# Altium schematic symbol library Analog Devices Data Converters Digital-to-Analog Converters.SchLib: 2231 symbols (part 41 of 135) (continued)
## AD5398BCPZ-REEL7
designator U?
Single 10-Bit Current Sinking Digital-to-Analog Converter with I2C Interface, 120 mA, -40 to +85 degC, CP-8-2, Pb-Free, Reel; Generic Part Number: AD5398; Manufacturer: Analog Devices; PartNumber: AD5398BCPZ-REEL7; # DAC Outputs: 1; Max V+: 5.5V; Op Pwr Diss: 20mW; Resolution (Bits): 10; Settling Time: 250µs; Single Supply: Yes; DatasheetVersion: Rev.B; PackageVersion: 061507-B; PackageReference: CP-8-2; PackageDescription: 8-Lead Lead Frame Chip Scale Package [LFCSP_VD] 3 x 3 mm Body, Very Thin, Dual Lead; Supplier 1: Digi-Key; Supplier Part Number 1: AD5398BCPZ-REEL7TR-ND; Supplier 2: Digi-Key; Supplier Part Number 2: AD5398BCPZ-REEL7CT-ND; Supplier 3: Digi-Key; Supplier Part Number 3: AD5398BCPZ-REEL7DKR-ND; Supplier 4: Mouser; Supplier Part Number 4: 584-AD5398BCPZ-R7; Packing: Reel; RoHS: Y; Mounting Technology: Surface Mount; ComponentLink1Description: Manufacturer URL; ComponentLink1URL: http://www.analog.com/en/index.html; ComponentLink2Description: Datasheet; ComponentLink2URL: http://www.analog.com/static/imported-files/data_sheets/AD5398.pdf; ComponentLink3Description: Package Specification; ComponentLink3URL: http://www.analog.com/static/imported-files/packages/56953322593982CP_8_2.pdf; ComponentLink4Description: Product URL; ComponentLink4URL: http://www.analog.com/en/digital-to-analog-converters/da-converters/ad5398/products/product.html
footprint CP-8-2_N (SON, 8-Leads, Body 3x3mm, Pitch 0.5mm, Thermal Pad 1.75x1.45mm, IPC Medium Density)
footprint CP-8-2_L (SON, 8-Leads, Body 3x3mm, Pitch 0.5mm, Thermal Pad 1.75x1.45mm, IPC High Density)
footprint CP-8-2_M (SON, 8-Leads, Body 3x3mm, Pitch 0.5mm, Thermal Pad 1.75x1.45mm, IPC Low Density)
pins: 1 PD (in) "Power Down. Asynchronous power-down signal.", 2 DGND (power) "Digital Ground Pin.", 3 SDA (io) "I2C Interface Signal.", 4 SCL (in) "I2C Interface Signal.", 5 DGND (power) "Digital Ground Pin.", 6 VDD (power) "Digital Supply Voltage.", 7 AGND (power) "Analog Ground Pin.", 8 ISINK (out) "Output Current Sink.", 9 EP (power) "The exposed paddle on the AD5398 should be soldered to ground to ensure the best possible thermal performance"

## AD5398D-WAFER
designator U?
Single 10-Bit Current Sinking Digital-to-Analog Converter with I2C Interface, 120 mA, CP-8-2, Pb-Free, Reel; Generic Part Number: AD5398; Manufacturer: Analog Devices; PartNumber: AD5398D-WAFER; # DAC Outputs: 1; Max V+: 5.5V; Op Pwr Diss: 20mW; Resolution (Bits): 10; Settling Time: 250µs; Single Supply: Yes; DatasheetVersion: Rev.B; PackageVersion: 061507-B; PackageReference: CP-8-2; PackageDescription: 8-Lead Lead Frame Chip Scale Package [LFCSP_VD] 3 x 3 mm Body, Very Thin, Dual Lead; Supplier 1: Mouser; Supplier Part Number 1: N/A; RoHS: Y; Mounting Technology: Surface Mount; ComponentLink1Description: Manufacturer URL; ComponentLink1URL: http://www.analog.com/en/index.html; ComponentLink2Description: Datasheet; ComponentLink2URL: http://www.analog.com/static/imported-files/data_sheets/AD5398.pdf; ComponentLink3Description: Package Specification; ComponentLink3URL: http://www.analog.com/static/imported-files/packages/56953322593982CP_8_2.pdf; ComponentLink4Description: Product URL; ComponentLink4URL: http://www.analog.com/en/digital-to-analog-converters/da-converters/ad5398/products/product.html
footprint CP-8-2_N (SON, 8-Leads, Body 3x3mm, Pitch 0.5mm, Thermal Pad 1.75x1.45mm, IPC Medium Density)
footprint CP-8-2_L (SON, 8-Leads, Body 3x3mm, Pitch 0.5mm, Thermal Pad 1.75x1.45mm, IPC High Density)
footprint CP-8-2_M (SON, 8-Leads, Body 3x3mm, Pitch 0.5mm, Thermal Pad 1.75x1.45mm, IPC Low Density)
pins: 1 PD (in) "Power Down. Asynchronous power-down signal.", 2 DGND (power) "Digital Ground Pin.", 3 SDA (io) "I2C Interface Signal.", 4 SCL (in) "I2C Interface Signal.", 5 DGND (power) "Digital Ground Pin.", 6 VDD (power) "Digital Supply Voltage.", 7 AGND (power) "Analog Ground Pin.", 8 ISINK (out) "Output Current Sink.", 9 EP (power) "The exposed paddle on the AD5398 should be soldered to ground to ensure the best possible thermal performance"

## AD5405YCPZ
designator U?
Dual 12-Bit High Bandwidth Multiplying Digital-to-Analog Converter, -40 to +125 degC, CP-40-1, Pb-Free, Tray; Generic Part Number: AD5405; Manufacturer: Analog Devices; PartNumber: AD5405YCPZ; # DAC Outputs: 2; Max V+: 5.5V; Op Pwr Diss: 50µW; Resolution (Bits): 12; Settling Time: 80ns; Single Supply: Yes; DatasheetVersion: Rev.B; PackageVersion: Oct-2006; PackageReference: CP-40-1; PackageDescription: 40-Pin Lead Frame Chip Scale Package [LFCSP_VQ] Very Thin Quad; Supplier 1: Digi-Key; Supplier Part Number 1: AD5405YCPZ-ND; Supplier 2: Farnell; Supplier Part Number 2: 1438371; Supplier 3: Newark; Supplier Part Number 3: 15P0675; Supplier 4: Newark; Supplier Part Number 4: 59K4099; Supplier 5: Mouser; Supplier Part Number 5: 584-AD5405YCPZ; Packing: Tray; RoHS: Y; Mounting Technology: Surface Mount; Code_JEDEC: MO-220-VJJD-2; ComponentLink1Description: Manufacturer URL; ComponentLink1URL: http://www.analog.com/en/index.html; ComponentLink2Description: Datasheet; ComponentLink2URL: http://www.analog.com/static/imported-files/data_sheets/AD5405.pdf; ComponentLink3Description: Package Specification; ComponentLink3URL: http://www.analog.com/static/imported-files/packages/PKG_PDF/LFCSP(CP)/CP_40_1.pdf; ComponentLink4Description: Product URL; ComponentLink4URL: http://www.analog.com/en/digital-to-analog-converters/da-converters/ad5405/products/product.html
footprint CP-40-1_N (QFN, 40-Leads, Body 6x6mm, Pitch 0.5mm, Thermal Pad 4.3x4.3mm, IPC Medium Density)
footprint CP-40-1_L (QFN, 40-Leads, Body 6x6mm, Pitch 0.5mm, Thermal Pad 4.3x4.3mm, IPC High Density)
footprint CP-40-1_M (QFN, 40-Leads, Body 6x6mm, Pitch 0.5mm, Thermal Pad 4.3x4.3mm, IPC Low Density)
pins: 1 R1A "DAC A 4-Quadrant Resistors. Allow a number of configuration modes, including bipolar operation with minimum of external components", 2 R2A "DAC A 4-Quadrant Resistors. Allow a number of configuration modes, including bipolar operation with minimum of external components", 3 R2_3A "DAC A 4-Quadrant Resistors. Allow a number of configuration modes, including bipolar operation with minimum of external components", 4 R3A "DAC A 4-Quadrant Resistors. Allow a number of configuration modes, including bipolar operation with minimum of external components", 5 VREFA (in) "DAC Reference Voltage Input Terminals.", 6 DGND (power) "Digital Ground Pin.", 7 ~{LDAC} (in) "Load DAC Input. Allows asynchronous or synchronous updates to the DAC output. The DAC is asynchronously updated when this signal goes low. Alternatively, if this line is held permanently low, an automatic or synchronous (See Datasheet)", 8 DAC ~{A}/B (in) "Selects DAC A or B. Low selects DAC A, and high selects DAC B.", 9 NC "Not internally connected.", 10 DB11 (in) "Parallel Data Bit 11", 11 DB10 (in) "Parallel Data Bit 10", 12 DB9 (in) "Parallel Data Bit 9", 13 DB8 (in) "Parallel Data Bit 8", 14 DB7 (in) "Parallel Data Bit 7", 15 DB6 (in) "Parallel Data Bit 6", 16 DB5 (in) "Parallel Data Bit 5", 17 DB4 (in) "Parallel Data Bit 4", 18 DB3 (in) "Parallel Data Bit 3", 19 DB2 (in) "Parallel Data Bit 2", 20 DB1 (in) "Parallel Data Bit 3", 21 DB0 (in) "Parallel Data Bit 0", 22 ~{CS} (in) "Chip Select Input. Active low. Used in conjunction with R/W\ to load parallel data to the input latch or to read data from the DAC register. Edge sensitive; when pulled high, the DAC data is latched.", 23 R/~{W} (in) "Read/Write. When low, used in conjunction with C\S\ to load parallel data. When high, used in conjunction with C\S\ to read back contents of DAC register.", 24 ~{CLR} (in) "Active Low Control Input. Clears DAC output and input and DAC registers.", 25 VDD (power) "Positive Power Supply Input. These parts can be operated from a supply of 2.5 V to 5.5 V.", 26 VREFB (in) "DAC Reference Voltage Input Terminals.", 27 R3B "DAC B 4-Quadrant Resistors. Allow a number of configuration modes, including bipolar operation with a minimum of external components.", 28 R2_3B "DAC B 4-Quadrant Resistors. Allow a number of configuration modes, including bipolar operation with a minimum of external components.", 29 R2B "DAC B 4-Quadrant Resistors. Allow a number of configuration modes, including bipolar operation with a minimum of external components.", 30 R1B "DAC B 4-Quadrant Resistors. Allow a number of configuration modes, including bipolar operation with a minimum of external components.", 31 RFBB (in) "External Amplifier Output.", 32 IOUT2B "DAC A Analog Ground. This pin typically should be tied to the analog ground of the system, but can be biased to achieve single-supply operation.", 33 IOUT1B (out) "DAC B Current Output.", 34 NC "Not internally connected.", 35 NC "Not internally connected.", 36 NC "Not internally connected.", 37 NC "Not internally connected.", 38 IOUT1A (out) "DAC A Current Output.", 39 IOUT2A "DAC A Analog Ground. This pin typically should be tied to the analog ground of the system, but can be biased to achieve single-supply operation.", 40 RFBA (in) "External Amplifier Output.", 41 EP (power) "Exposed pad must be connected to ground."

## AD5405YCPZ-REEL
designator U?
Dual 12-Bit High Bandwidth Multiplying Digital-to-Analog Converter, -40 to +125 degC, CP-40-1, Pb-Free, Reel; Generic Part Number: AD5405; Manufacturer: Analog Devices; PartNumber: AD5405YCPZ-REEL; # DAC Outputs: 2; Max V+: 5.5V; Op Pwr Diss: 50µW; Resolution (Bits): 12; Settling Time: 80ns; Single Supply: Yes; DatasheetVersion: Rev.B; PackageVersion: Oct-2006; PackageReference: CP-40-1; PackageDescription: 40-Pin Lead Frame Chip Scale Package [LFCSP_VQ] Very Thin Quad; Supplier 1: Digi-Key; Supplier Part Number 1: AD5405YCPZ-REEL-ND; Supplier 2: Newark; Supplier Part Number 2: 59K4100; Supplier 3: Mouser; Supplier Part Number 3: 584-AD5405YCPZ-R; Packing: Reel; RoHS: Y; Mounting Technology: Surface Mount; Code_JEDEC: MO-220-VJJD-2; ComponentLink1Description: Manufacturer URL; ComponentLink1URL: http://www.analog.com/en/index.html; ComponentLink2Description: Datasheet; ComponentLink2URL: http://www.analog.com/static/imported-files/data_sheets/AD5405.pdf; ComponentLink3Description: Package Specification; ComponentLink3URL: http://www.analog.com/static/imported-files/packages/PKG_PDF/LFCSP(CP)/CP_40_1.pdf; ComponentLink4Description: Product URL; ComponentLink4URL: http://www.analog.com/en/digital-to-analog-converters/da-converters/ad5405/products/product.html
footprint CP-40-1_N (QFN, 40-Leads, Body 6x6mm, Pitch 0.5mm, Thermal Pad 4.3x4.3mm, IPC Medium Density)
footprint CP-40-1_L (QFN, 40-Leads, Body 6x6mm, Pitch 0.5mm, Thermal Pad 4.3x4.3mm, IPC High Density)
footprint CP-40-1_M (QFN, 40-Leads, Body 6x6mm, Pitch 0.5mm, Thermal Pad 4.3x4.3mm, IPC Low Density)
pins: 1 R1A "DAC A 4-Quadrant Resistors. Allow a number of configuration modes, including bipolar operation with minimum of external components", 2 R2A "DAC A 4-Quadrant Resistors. Allow a number of configuration modes, including bipolar operation with minimum of external components", 3 R2_3A "DAC A 4-Quadrant Resistors. Allow a number of configuration modes, including bipolar operation with minimum of external components", 4 R3A "DAC A 4-Quadrant Resistors. Allow a number of configuration modes, including bipolar operation with minimum of external components", 5 VREFA (in) "DAC Reference Voltage Input Terminals.", 6 DGND (power) "Digital Ground Pin.", 7 ~{LDAC} (in) "Load DAC Input. Allows asynchronous or synchronous updates to the DAC output. The DAC is asynchronously updated when this signal goes low. Alternatively, if this line is held permanently low, an automatic or synchronous (See Datasheet)", 8 DAC ~{A}/B (in) "Selects DAC A or B. Low selects DAC A, and high selects DAC B.", 9 NC "Not internally connected.", 10 DB11 (in) "Parallel Data Bit 11", 11 DB10 (in) "Parallel Data Bit 10", 12 DB9 (in) "Parallel Data Bit 9", 13 DB8 (in) "Parallel Data Bit 8", 14 DB7 (in) "Parallel Data Bit 7", 15 DB6 (in) "Parallel Data Bit 6", 16 DB5 (in) "Parallel Data Bit 5", 17 DB4 (in) "Parallel Data Bit 4", 18 DB3 (in) "Parallel Data Bit 3", 19 DB2 (in) "Parallel Data Bit 2", 20 DB1 (in) "Parallel Data Bit 3", 21 DB0 (in) "Parallel Data Bit 0", 22 ~{CS} (in) "Chip Select Input. Active low. Used in conjunction with R/W\ to load parallel data to the input latch or to read data from the DAC register. Edge sensitive; when pulled high, the DAC data is latched.", 23 R/~{W} (in) "Read/Write. When low, used in conjunction with C\S\ to load parallel data. When high, used in conjunction with C\S\ to read back contents of DAC register.", 24 ~{CLR} (in) "Active Low Control Input. Clears DAC output and input and DAC registers.", 25 VDD (power) "Positive Power Supply Input. These parts can be operated from a supply of 2.5 V to 5.5 V.", 26 VREFB (in) "DAC Reference Voltage Input Terminals.", 27 R3B "DAC B 4-Quadrant Resistors. Allow a number of configuration modes, including bipolar operation with a minimum of external components.", 28 R2_3B "DAC B 4-Quadrant Resistors. Allow a number of configuration modes, including bipolar operation with a minimum of external components.", 29 R2B "DAC B 4-Quadrant Resistors. Allow a number of configuration modes, including bipolar operation with a minimum of external components.", 30 R1B "DAC B 4-Quadrant Resistors. Allow a number of configuration modes, including bipolar operation with a minimum of external components.", 31 RFBB (in) "External Amplifier Output.", 32 IOUT2B "DAC A Analog Ground. This pin typically should be tied to the analog ground of the system, but can be biased to achieve single-supply operation.", 33 IOUT1B (out) "DAC B Current Output.", 34 NC "Not internally connected.", 35 NC "Not internally connected.", 36 NC "Not internally connected.", 37 NC "Not internally connected.", 38 IOUT1A (out) "DAC A Current Output.", 39 IOUT2A "DAC A Analog Ground. This pin typically should be tied to the analog ground of the system, but can be biased to achieve single-supply operation.", 40 RFBA (in) "External Amplifier Output.", 41 EP (power) "Exposed pad must be connected to ground."

## AD5405YCPZ-REEL7
designator U?
Dual 12-Bit High Bandwidth Multiplying Digital-to-Analog Converter, -40 to +125 degC, CP-40-1, Pb-Free, Reel; Generic Part Number: AD5405; Manufacturer: Analog Devices; PartNumber: AD5405YCPZ-REEL7; # DAC Outputs: 2; Max V+: 5.5V; Op Pwr Diss: 50µW; Resolution (Bits): 12; Settling Time: 80ns; Single Supply: Yes; DatasheetVersion: Rev.B; PackageVersion: Oct-2006; PackageReference: CP-40-1; PackageDescription: 40-Pin Lead Frame Chip Scale Package [LFCSP_VQ] Very Thin Quad; Supplier 1: Digi-Key; Supplier Part Number 1: AD5405YCPZ-REEL7-ND; Supplier 2: Newark; Supplier Part Number 2: 59K4101; Supplier 3: Mouser; Supplier Part Number 3: 584-AD5405YCPZ-R7; Packing: Reel; RoHS: Y; Mounting Technology: Surface Mount; Code_JEDEC: MO-220-VJJD-2; ComponentLink1Description: Manufacturer URL; ComponentLink1URL: http://www.analog.com/en/index.html; ComponentLink2Description: Datasheet; ComponentLink2URL: http://www.analog.com/static/imported-files/data_sheets/AD5405.pdf; ComponentLink3Description: Package Specification; ComponentLink3URL: http://www.analog.com/static/imported-files/packages/PKG_PDF/LFCSP(CP)/CP_40_1.pdf; ComponentLink4Description: Product URL; ComponentLink4URL: http://www.analog.com/en/digital-to-analog-converters/da-converters/ad5405/products/product.html
footprint CP-40-1_N (QFN, 40-Leads, Body 6x6mm, Pitch 0.5mm, Thermal Pad 4.3x4.3mm, IPC Medium Density)
footprint CP-40-1_L (QFN, 40-Leads, Body 6x6mm, Pitch 0.5mm, Thermal Pad 4.3x4.3mm, IPC High Density)
footprint CP-40-1_M (QFN, 40-Leads, Body 6x6mm, Pitch 0.5mm, Thermal Pad 4.3x4.3mm, IPC Low Density)
pins: 1 R1A "DAC A 4-Quadrant Resistors. Allow a number of configuration modes, including bipolar operation with minimum of external components", 2 R2A "DAC A 4-Quadrant Resistors. Allow a number of configuration modes, including bipolar operation with minimum of external components", 3 R2_3A "DAC A 4-Quadrant Resistors. Allow a number of configuration modes, including bipolar operation with minimum of external components", 4 R3A "DAC A 4-Quadrant Resistors. Allow a number of configuration modes, including bipolar operation with minimum of external components", 5 VREFA (in) "DAC Reference Voltage Input Terminals.", 6 DGND (power) "Digital Ground Pin.", 7 ~{LDAC} (in) "Load DAC Input. Allows asynchronous or synchronous updates to the DAC output. The DAC is asynchronously updated when this signal goes low. Alternatively, if this line is held permanently low, an automatic or synchronous (See Datasheet)", 8 DAC ~{A}/B (in) "Selects DAC A or B. Low selects DAC A, and high selects DAC B.", 9 NC "Not internally connected.", 10 DB11 (in) "Parallel Data Bit 11", 11 DB10 (in) "Parallel Data Bit 10", 12 DB9 (in) "Parallel Data Bit 9", 13 DB8 (in) "Parallel Data Bit 8", 14 DB7 (in) "Parallel Data Bit 7", 15 DB6 (in) "Parallel Data Bit 6", 16 DB5 (in) "Parallel Data Bit 5", 17 DB4 (in) "Parallel Data Bit 4", 18 DB3 (in) "Parallel Data Bit 3", 19 DB2 (in) "Parallel Data Bit 2", 20 DB1 (in) "Parallel Data Bit 3", 21 DB0 (in) "Parallel Data Bit 0", 22 ~{CS} (in) "Chip Select Input. Active low. Used in conjunction with R/W\ to load parallel data to the input latch or to read data from the DAC register. Edge sensitive; when pulled high, the DAC data is latched.", 23 R/~{W} (in) "Read/Write. When low, used in conjunction with C\S\ to load parallel data. When high, used in conjunction with C\S\ to read back contents of DAC register.", 24 ~{CLR} (in) "Active Low Control Input. Clears DAC output and input and DAC registers.", 25 VDD (power) "Positive Power Supply Input. These parts can be operated from a supply of 2.5 V to 5.5 V.", 26 VREFB (in) "DAC Reference Voltage Input Terminals.", 27 R3B "DAC B 4-Quadrant Resistors. Allow a number of configuration modes, including bipolar operation with a minimum of external components.", 28 R2_3B "DAC B 4-Quadrant Resistors. Allow a number of configuration modes, including bipolar operation with a minimum of external components.", 29 R2B "DAC B 4-Quadrant Resistors. Allow a number of configuration modes, including bipolar operation with a minimum of external components.", 30 R1B "DAC B 4-Quadrant Resistors. Allow a number of configuration modes, including bipolar operation with a minimum of external components.", 31 RFBB (in) "External Amplifier Output.", 32 IOUT2B "DAC A Analog Ground. This pin typically should be tied to the analog ground of the system, but can be biased to achieve single-supply operation.", 33 IOUT1B (out) "DAC B Current Output.", 34 NC "Not internally connected.", 35 NC "Not internally connected.", 36 NC "Not internally connected.", 37 NC "Not internally connected.", 38 IOUT1A (out) "DAC A Current Output.", 39 IOUT2A "DAC A Analog Ground. This pin typically should be tied to the analog ground of the system, but can be biased to achieve single-supply operation.", 40 RFBA (in) "External Amplifier Output.", 41 EP (power) "Exposed pad must be connected to ground."

## AD5410ACPZ-REEL
designator U?
Single 12-Bit Current Source Digital-to-Analog Converter with Serial Interface and HART Connectivity, 4 to 20 mA, -40 to +85 degC, CP-40-1, Pb-Free, Reel; Generic Part Number: AD5410; Manufacturer: Analog Devices; PartNumber: AD5410ACPZ-REEL; # DAC Outputs: 1; Max V+: 26.4V; Resolution (Bits): 12; DatasheetVersion: Rev.D; PackageVersion: Oct-2006; PackageReference: CP-40-1; PackageDescription: 40-Pin Lead Frame Chip Scale Package [LFCSP_VQ] Very Thin Quad; Supplier 1: Digi-Key; Supplier Part Number 1: AD5410ACPZ-REELTR-ND; Supplier 2: Digi-Key; Supplier Part Number 2: AD5410ACPZ-REELCT-ND; Supplier 3: Digi-Key; Supplier Part Number 3: AD5410ACPZ-REELDKR-ND; Supplier 4: Mouser; Supplier Part Number 4: 584-AD5410ACPZ-R; Packing: Reel; RoHS: Y; Mounting Technology: Surface Mount; Code_JEDEC: MO-220-VJJD-2; ComponentLink1Description: Manufacturer URL; ComponentLink1URL: http://www.analog.com/en/index.html; ComponentLink2Description: Datasheet; ComponentLink2URL: http://www.analog.com/static/imported-files/data_sheets/AD5410_5420.pdf; ComponentLink3Description: Package Specification; ComponentLink3URL: http://www.analog.com/static/imported-files/packages/PKG_PDF/LFCSP(CP)/CP_40_1.pdf; ComponentLink4Description: Product URL; ComponentLink4URL: http://www.analog.com/en/digital-to-analog-converters/da-converters/ad5410/products/product.html; ComponentLink5Description: Reference Design URL; ComponentLink5URL: http://www.analog.com/en/digital-to-analog-converters/da-converters/ad5410/products/product.html#prod_cross_sell
footprint CP-40-1_N (QFN, 40-Leads, Body 6x6mm, Pitch 0.5mm, Thermal Pad 4.3x4.3mm, IPC Medium Density)
footprint CP-40-1_L (QFN, 40-Leads, Body 6x6mm, Pitch 0.5mm, Thermal Pad 4.3x4.3mm, IPC High Density)
footprint CP-40-1_M (QFN, 40-Leads, Body 6x6mm, Pitch 0.5mm, Thermal Pad 4.3x4.3mm, IPC Low Density)
part A pins: 2 ~{FAULT} (oc) "Fault Alert. This pin is asserted low when an open circuit is detected between IOUT and GND or an overtemperature is detected. The F\A\U\L\T\ pin is an open-drain output and must be connected to DVCC through a pull-up (See Datasheet)", 3 GND (power) "These pins must be connected to ground.", 4 GND (power) "These pins must be connected to ground.", 5 CLEAR (in) "Active High Input. Asserting this pin sets the output current to the zero-scale value, which is either 0 mA or 4 mA, depending on the output range programmed, that is, 0 mA to 20 mA, 0 mA to 24 mA, or 4 mA to 20 mA.", 6 LATCH (in) "Positive Edge Sensitive Latch. A rising edge parallel loads the input shift register data into the relevant register. In the case of the data register, the output current is also updated.", 7 SCLK (in) "Serial Clock Input. Data is clocked into the input shift register on the rising edge of SCLK. This operates at clock speeds of up to 30 MHz.", 8 SDIN (in) "Serial Data Input. Data must be valid on the rising edge of SCLK.", 9 SDO (hiz) "Serial Data Output. This pin is used to clock data from the device in daisy-chain or readback mode. Data is clocked out on the falling edge of SCLK. See Figure 3 and Figure 4.", 12 GND (power) "Ground Reference Pin.", 13 GND (power) "Ground Reference Pin.", 14 GND (power) "These pins must be connected to ground.", 15 GND (power) "These pins must be connected to ground.", 16 RSET (in) "An external, precision, low drift 15 k ohm current setting resistor can be connected to this pin to improve the overall performance of the device. See the Specifications and AD5410 Features sections.", 17 REFOUT (out) "Internal Reference Voltage Output. VREFOUT = 5 V +/- 5 mV at TA = 25degC. Typical temperature drift is 1.8 ppm/degC.", 18 REFIN (in) "External Reference Voltage Input. VREFIN = 5 V +/- 50 mV for specified performance.", 23 DVCC SELECT "This pin, when connected to GND, disables the internal supply, and an external supply must be connected to the DVCC pin. Leave this pin unconnected to enable the internal supply. See the AD5410 Features section.", 25 R3SENSE (out) "The voltage measured between this pin and the BOOST pin is directly proportional to the output current and can be used as a monitor/feedback feature. This should be used as a voltage sense output only; current should not be (See Datasheet)", 26 IOUT (out) "Current Output Pin.", 27 BOOST (out) "Optional External Transistor Connection. Connecting an external transistor reduces the power dissipated in the AD5410. See the AD5410 Features section.", 28 CAP1 "Connection for Optional Output Filtering Capacitor. See the AD5410 Features section.", 29 CAP2 "Connection for Optional Output Filtering Capacitor. See the AD5410 Features section. Also HART Input Connection, see Device Features Section.", 36 AVDD (power) "Positive Analog Supply Pin. Voltage ranges from 10.8 V to 40 V.", 37 GND (power) "These pins must be connected to ground.", 39 DVCC (power) "Digital Supply Pin. Voltage ranges from 2.7 V to 5.5 V.", 41 EP (power) "Ground Reference Connection. It is recommended that the exposed pad be thermally connected to a copper plane for enhanced thermal performance."
part B pins: 1 NC "Do not connect to these pins.", 10 NC "Do not connect to these pins.", 11 NC "Do not connect to these pins.", 19 NC "Do not connect to these pins.", 20 NC "Do not connect to these pins.", 21 NC "Do not connect to these pins.", 22 NC "Do not connect to these pins.", 24 NC "Do not connect to these pins.", 30 NC "Do not connect to these pins.", 31 NC "Do not connect to these pins.", 32 NC "Do not connect to these pins.", 33 NC "Do not connect to these pins.", 34 NC "Do not connect to these pins.", 35 NC "Do not connect to these pins.", 38 NC "Do not connect to these pins.", 40 NC "Do not connect to these pins."

## AD5410ACPZ-REEL7
designator U?
Single 12-Bit Current Source Digital-to-Analog Converter with Serial Interface and HART Connectivity, 4 to 20 mA, -40 to +85 degC, CP-40-1, Pb-Free, Reel; Generic Part Number: AD5410; Manufacturer: Analog Devices; PartNumber: AD5410ACPZ-REEL7; # DAC Outputs: 1; Max V+: 26.4V; Resolution (Bits): 12; DatasheetVersion: Rev.D; PackageVersion: Oct-2006; PackageReference: CP-40-1; PackageDescription: 40-Pin Lead Frame Chip Scale Package [LFCSP_VQ] Very Thin Quad; Supplier 1: Digi-Key; Supplier Part Number 1: AD5410ACPZ-REEL7TR-ND; Supplier 2: Digi-Key; Supplier Part Number 2: AD5410ACPZ-REEL7CT-ND; Supplier 3: Digi-Key; Supplier Part Number 3: AD5410ACPZ-REEL7DKR-ND; Supplier 4: Mouser; Supplier Part Number 4: 584-AD5410ACPZ-R7; Packing: Reel; RoHS: Y; Mounting Technology: Surface Mount; Code_JEDEC: MO-220-VJJD-2; ComponentLink1Description: Manufacturer URL; ComponentLink1URL: http://www.analog.com/en/index.html; ComponentLink2Description: Datasheet; ComponentLink2URL: http://www.analog.com/static/imported-files/data_sheets/AD5410_5420.pdf; ComponentLink3Description: Package Specification; ComponentLink3URL: http://www.analog.com/static/imported-files/packages/PKG_PDF/LFCSP(CP)/CP_40_1.pdf; ComponentLink4Description: Product URL; ComponentLink4URL: http://www.analog.com/en/digital-to-analog-converters/da-converters/ad5410/products/product.html; ComponentLink5Description: Reference Design URL; ComponentLink5URL: http://www.analog.com/en/digital-to-analog-converters/da-converters/ad5410/products/product.html#prod_cross_sell
footprint CP-40-1_N (QFN, 40-Leads, Body 6x6mm, Pitch 0.5mm, Thermal Pad 4.3x4.3mm, IPC Medium Density)
footprint CP-40-1_L (QFN, 40-Leads, Body 6x6mm, Pitch 0.5mm, Thermal Pad 4.3x4.3mm, IPC High Density)
footprint CP-40-1_M (QFN, 40-Leads, Body 6x6mm, Pitch 0.5mm, Thermal Pad 4.3x4.3mm, IPC Low Density)
part A pins: 2 ~{FAULT} (oc) "Fault Alert. This pin is asserted low when an open circuit is detected between IOUT and GND or an overtemperature is detected. The F\A\U\L\T\ pin is an open-drain output and must be connected to DVCC through a pull-up (See Datasheet)", 3 GND (power) "These pins must be connected to ground.", 4 GND (power) "These pins must be connected to ground.", 5 CLEAR (in) "Active High Input. Asserting this pin sets the output current to the zero-scale value, which is either 0 mA or 4 mA, depending on the output range programmed, that is, 0 mA to 20 mA, 0 mA to 24 mA, or 4 mA to 20 mA.", 6 LATCH (in) "Positive Edge Sensitive Latch. A rising edge parallel loads the input shift register data into the relevant register. In the case of the data register, the output current is also updated.", 7 SCLK (in) "Serial Clock Input. Data is clocked into the input shift register on the rising edge of SCLK. This operates at clock speeds of up to 30 MHz.", 8 SDIN (in) "Serial Data Input. Data must be valid on the rising edge of SCLK.", 9 SDO (hiz) "Serial Data Output. This pin is used to clock data from the device in daisy-chain or readback mode. Data is clocked out on the falling edge of SCLK. See Figure 3 and Figure 4.", 12 GND (power) "Ground Reference Pin.", 13 GND (power) "Ground Reference Pin.", 14 GND (power) "These pins must be connected to ground.", 15 GND (power) "These pins must be connected to ground.", 16 RSET (in) "An external, precision, low drift 15 k ohm current setting resistor can be connected to this pin to improve the overall performance of the device. See the Specifications and AD5410 Features sections.", 17 REFOUT (out) "Internal Reference Voltage Output. VREFOUT = 5 V +/- 5 mV at TA = 25degC. Typical temperature drift is 1.8 ppm/degC.", 18 REFIN (in) "External Reference Voltage Input. VREFIN = 5 V +/- 50 mV for specified performance.", 23 DVCC SELECT "This pin, when connected to GND, disables the internal supply, and an external supply must be connected to the DVCC pin. Leave this pin unconnected to enable the internal supply. See the AD5410 Features section.", 25 R3SENSE (out) "The voltage measured between this pin and the BOOST pin is directly proportional to the output current and can be used as a monitor/feedback feature. This should be used as a voltage sense output only; current should not be (See Datasheet)", 26 IOUT (out) "Current Output Pin.", 27 BOOST (out) "Optional External Transistor Connection. Connecting an external transistor reduces the power dissipated in the AD5410. See the AD5410 Features section.", 28 CAP1 "Connection for Optional Output Filtering Capacitor. See the AD5410 Features section.", 29 CAP2 "Connection for Optional Output Filtering Capacitor. See the AD5410 Features section. Also HART Input Connection, see Device Features Section.", 36 AVDD (power) "Positive Analog Supply Pin. Voltage ranges from 10.8 V to 40 V.", 37 GND (power) "These pins must be connected to ground.", 39 DVCC (power) "Digital Supply Pin. Voltage ranges from 2.7 V to 5.5 V.", 41 EP (power) "Ground Reference Connection. It is recommended that the exposed pad be thermally connected to a copper plane for enhanced thermal performance."
part B pins: 1 NC "Do not connect to these pins.", 10 NC "Do not connect to these pins.", 11 NC "Do not connect to these pins.", 19 NC "Do not connect to these pins.", 20 NC "Do not connect to these pins.", 21 NC "Do not connect to these pins.", 22 NC "Do not connect to these pins.", 24 NC "Do not connect to these pins.", 30 NC "Do not connect to these pins.", 31 NC "Do not connect to these pins.", 32 NC "Do not connect to these pins.", 33 NC "Do not connect to these pins.", 34 NC "Do not connect to these pins.", 35 NC "Do not connect to these pins.", 38 NC "Do not connect to these pins.", 40 NC "Do not connect to these pins."

## AD5410AREZ
designator U?
Single 12-Bit Current Source Digital-to-Analog Converter with Serial Interface and HART Connectivity, 4 to 20 mA, -40 to +85 degC, RE-24, Pb-Free, Tube; Generic Part Number: AD5410; Manufacturer: Analog Devices; PartNumber: AD5410AREZ; # DAC Outputs: 1; Max V+: 26.4V; Resolution (Bits): 12; DatasheetVersion: Rev.D; PackageVersion: 050806-A; PackageReference: RE-24; PackageDescription: 24-Lead Thin Shrink Small Outline Package, Exposed Pad [TSSOP_EP]; Supplier 1: Digi-Key; Supplier Part Number 1: AD5410AREZ-ND; Supplier 2: Farnell; Supplier Part Number 2: 1827275; Supplier 3: Newark; Supplier Part Number 3: 71P7860; Supplier 4: Mouser; Supplier Part Number 4: 584-AD5410AREZ; Packing: Tube; RoHS: Y; Mounting Technology: Surface Mount; Code_JEDEC: MO-153-ADT; ComponentLink1Description: Manufacturer URL; ComponentLink1URL: http://www.analog.com/en/index.html; ComponentLink2Description: Datasheet; ComponentLink2URL: http://www.analog.com/static/imported-files/data_sheets/AD5410_5420.pdf; ComponentLink3Description: Package Specification; ComponentLink3URL: http://www.analog.com/static/imported-files/packages/PKG_PDF/TSSOP_EP(RE)/RE_24.pdf; ComponentLink4Description: Product URL; ComponentLink4URL: http://www.analog.com/en/digital-to-analog-converters/da-converters/ad5410/products/product.html; ComponentLink5Description: Reference Design URL; ComponentLink5URL: http://www.analog.com/en/digital-to-analog-converters/da-converters/ad5410/products/product.html#prod_cross_sell
footprint RE-24_N (TSOP, 24-Leads, Body 7.8x4.4mm, Pitch 0.65mm, Thermal pad 5.02x3.25 mm, IPC Medium Density)
footprint RE-24_L (TSOP, 24-Leads, Body 7.8x4.4mm, Pitch 0.65mm, Thermal pad 5.02x3.25 mm, IPC High Density)
footprint RE-24_M (TSOP, 24-Leads, Body 7.8x4.4mm, Pitch 0.65mm, Thermal pad 5.02x3.25 mm, IPC Low Density)
pins: 1 GND (power) "These pins must be connected to ground.", 2 DVCC (power) "Digital Supply Pin. Voltage ranges from 2.7 V to 5.5 V.", 3 ~{FAULT} (hiz) "Fault Alert. This pin is asserted low when an open circuit is detected between IOUT and GND or an overtemperature is detected. The F\A\U\L\T\ pin is an open-drain output and must be connected to DVCC through a pull-up (See Datasheet)", 4 GND (power) "These pins must be connected to ground.", 5 GND (power) "These pins must be connected to ground.", 6 CLEAR (in) "Active High Input. Asserting this pin sets the output current to the zero-scale value, which is either 0 mA or 4 mA, depending on the output range programmed, that is, 0 mA to 20 mA, 0 mA to 24 mA, or 4 mA to 20 mA.", 7 LATCH (in) "Positive Edge Sensitive Latch. A rising edge parallel loads the input shift register data into the relevant register. In the case of the data register, the output current is also updated.", 8 SCLK (in) "Serial Clock Input. Data is clocked into the input shift register on the rising edge of SCLK. This operates at clock speeds of up to 30 MHz.", 9 SDIN (in) "Serial Data Input. Data must be valid on the rising edge of SCLK.", 10 SDO (hiz) "Serial Data Output. This pin is used to clock data from the device in daisy-chain or readback mode. Data is clocked out on the falling edge of SCLK. See Figure 3 and Figure 4.", 11 GND (power) "Ground Reference Pin.", 12 GND (power) "These pins must be connected to ground.", 13 RSET (in) "An external, precision, low drift 15 k ohm current setting resistor can be connected to this pin to improve the overall performance of the device. See the Specifications and AD5410 Features sections.", 14 REFOUT (hiz) "Internal Reference Voltage Output. VREFOUT = 5 V +/- 5 mV at TA = 25degC. Typical temperature drift is 1.8 ppm/degC.", 15 REFIN (in) "External Reference Voltage Input. VREFIN = 5 V +/- 50 mV for specified performance.", 16 DVCC SELECT "This pin, when connected to GND, disables the internal supply, and an external supply must be connected to the DVCC pin. Leave this pin unconnected to enable the internal supply. See the AD5410 Features section.", 17 NC "Do not connect to these pins.", 18 R3SENSE (hiz) "The voltage measured between this pin and the BOOST pin is directly proportional to the output current and can be used as a monitor/feedback feature. This should be used as a voltage sense output only; current should not be (See Datasheet)", 19 IOUT (hiz) "Current Output Pin.", 20 BOOST "Optional External Transistor Connection. Connecting an external transistor reduces the power dissipated in the AD5410. See the AD5410 Features section.", 21 CAP1 "Connection for Optional Output Filtering Capacitor. See the AD5410 Features section.", 22 CAP2 "Connection for Optional Output Filtering Capacitor. See the AD5410 Features section. Also HART Input Connection, see Device Features Section.", 23 NC "Do not connect to these pins.", 24 AVDD (power) "Positive Analog Supply Pin. Voltage ranges from 10.8 V to 40 V.", 25 EP (power) "Ground Reference Connection. It is recommended that the exposed pad be thermally connected to a copper plane for enhanced thermal performance."